# Altium footprint library CONN_HDR_MINI_ST.PcbLib: 116 footprints (part 5 of 10)
Each footprint in its own frame and in the unit in brackets; x right, y up, seen from the top. Pads: shape width x height; smd on the part's side, far side on the other; paste and mask are expansions set on the pad; w line width, h text height; cw(c..) or ccw(c..) is an arc to the next point about the centre after c.
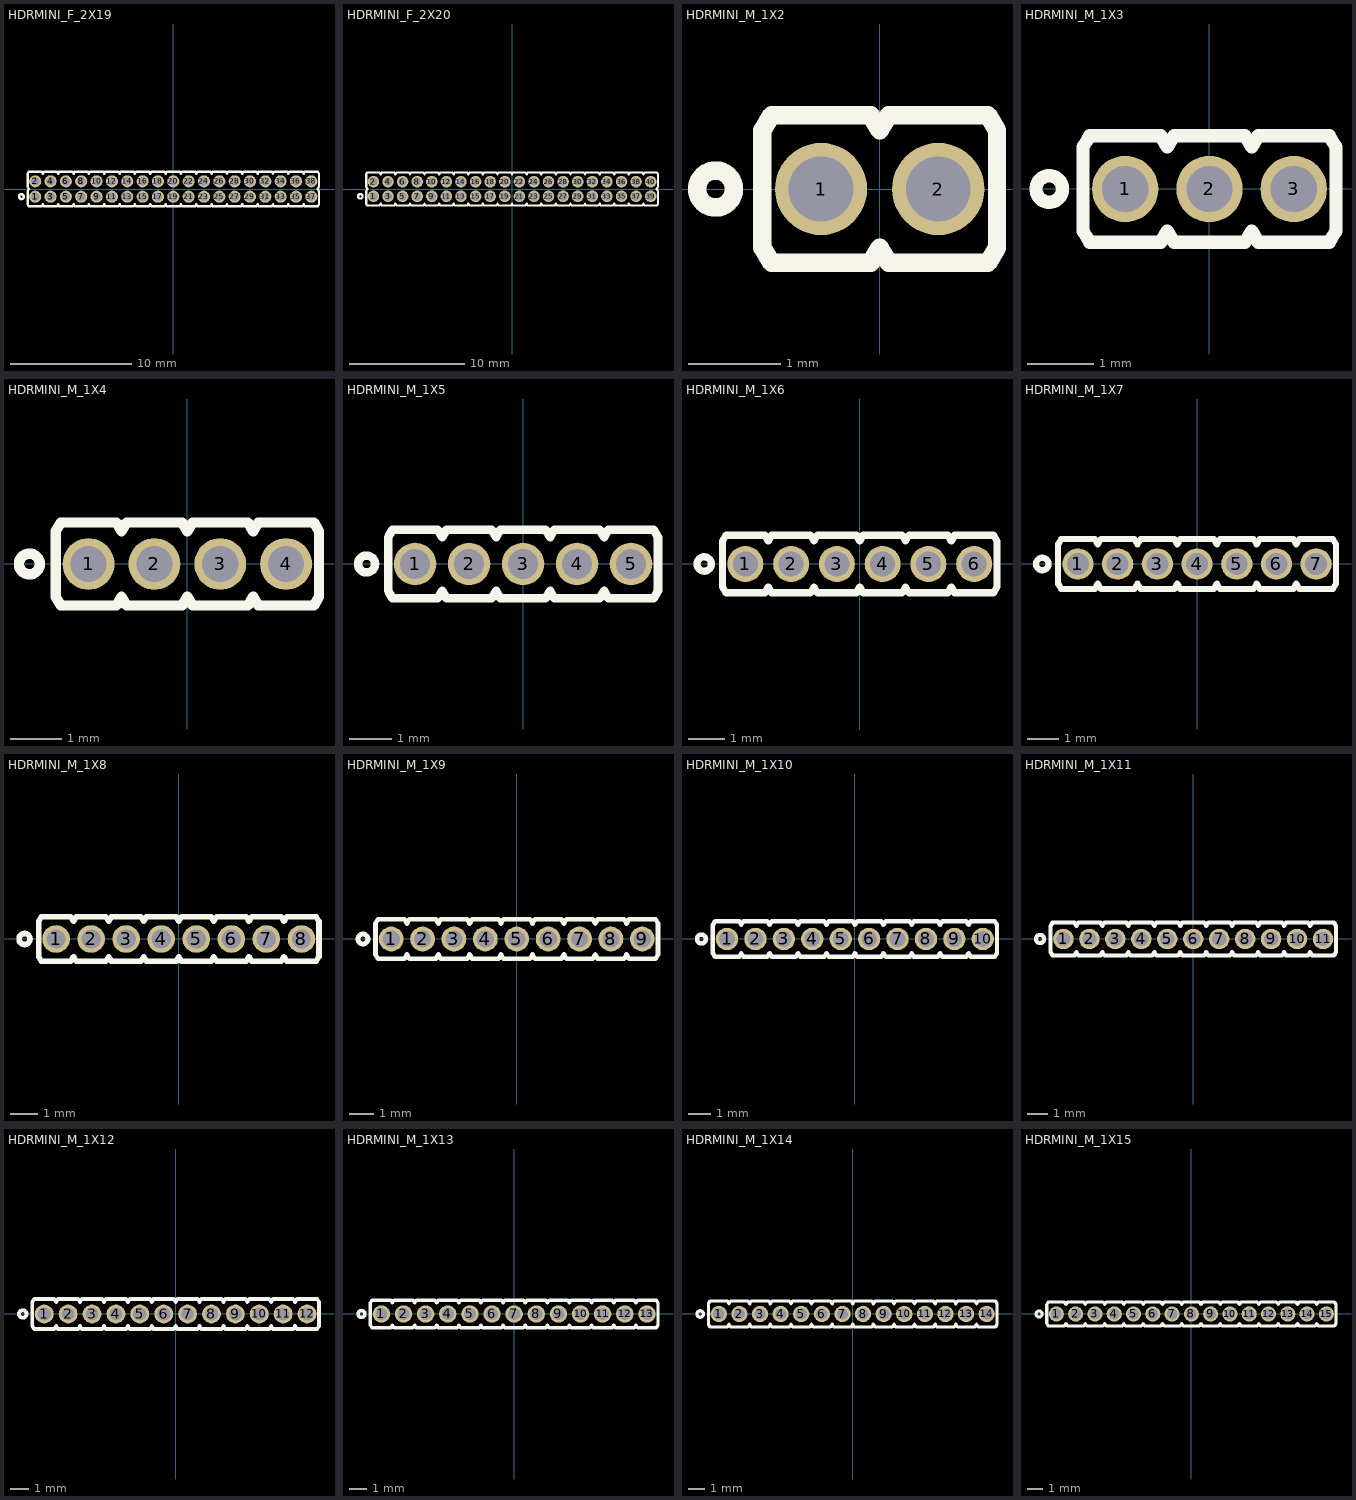
[diagram p4: the footprints below, top view; thin cyan lines are the x and y axes]

## HDRMINI_F_2X19 [mm] "mini header (50mil pitch)"
pads (38):
  round 1 hole 0.7 mask+0.05: 1(-11.43,-0.635) 2(-11.43,0.635) 3(-10.16,-0.635) 4(-10.16,0.635) 5(-8.89,-0.635) 6(-8.89,0.635) 7(-7.62,-0.635) 8(-7.62,0.635) 9(-6.35,-0.635) 10(-6.35,0.635) 11(-5.08,-0.635) 12(-5.08,0.635) 13(-3.81,-0.635) 14(-3.81,0.635) 15(-2.54,-0.635) 16(-2.54,0.635) 17(-1.27,-0.635) 18(-1.27,0.635) 19(0,-0.635) 20(0,0.635) 21(1.27,-0.635) 22(1.27,0.635) 23(2.54,-0.635) 24(2.54,0.635) 25(3.81,-0.635) 26(3.81,0.635) 27(5.08,-0.635) 28(5.08,0.635) 29(6.35,-0.635) 30(6.35,0.635) 31(7.62,-0.635) 32(7.62,0.635) 33(8.89,-0.635) 34(8.89,0.635) 35(10.16,-0.635) 36(10.16,0.635) 37(11.43,-0.635) 38(11.43,0.635)
Top Overlay:
  circle w0.2: c-12.573,-0.635 r0.2
  lines w0.2: -11.966,-0.035 -12.065,-0.2 -12.065,-1.27 -11.966,-1.435 -10.894,-1.435 -10.795,-1.27 -10.696,-1.435 -9.624,-1.435 -9.525,-1.27 -9.426,-1.435 -8.354,-1.435 -8.255,-1.27 -8.156,-1.435 -7.084,-1.435 -6.985,-1.27 -6.886,-1.435 -5.814,-1.435 -5.715,-1.27 -5.616,-1.435 -4.544,-1.435 -4.445,-1.27 -4.346,-1.435 -3.274,-1.435 -3.175,-1.27 -3.076,-1.435 -2.004,-1.435 -1.905,-1.27 -1.806,-1.435 -0.734,-1.435 -0.635,-1.27 -0.536,-1.435 0.536,-1.435 0.635,-1.27 0.734,-1.435 1.806,-1.435 1.905,-1.27 2.004,-1.435 3.076,-1.435 3.175,-1.27 3.274,-1.435 4.346,-1.435 4.445,-1.27 4.544,-1.435 5.616,-1.435 5.715,-1.27 5.814,-1.435 6.886,-1.435 6.985,-1.27 7.084,-1.435 8.156,-1.435 8.255,-1.27 8.354,-1.435 9.426,-1.435 9.525,-1.27 9.624,-1.435 10.696,-1.435 10.795,-1.27 10.894,-1.435 11.966,-1.435 12.065,-1.27 12.065,-0.2 11.966,-0.035 ; -11.966,0.035 -12.065,0.2 -12.065,1.27 -11.966,1.435 -10.894,1.435 -10.795,1.27 -10.696,1.435 -9.624,1.435 -9.525,1.27 -9.426,1.435 -8.354,1.435 -8.255,1.27 -8.156,1.435 -7.084,1.435 -6.985,1.27 -6.886,1.435 -5.814,1.435 -5.715,1.27 -5.616,1.435 -4.544,1.435 -4.445,1.27 -4.346,1.435 -3.274,1.435 -3.175,1.27 -3.076,1.435 -2.004,1.435 -1.905,1.27 -1.806,1.435 -0.734,1.435 -0.635,1.27 -0.536,1.435 0.536,1.435 0.635,1.27 0.734,1.435 1.806,1.435 1.905,1.27 2.004,1.435 3.076,1.435 3.175,1.27 3.274,1.435 4.346,1.435 4.445,1.27 4.544,1.435 5.616,1.435 5.715,1.27 5.814,1.435 6.886,1.435 6.985,1.27 7.084,1.435 8.156,1.435 8.255,1.27 8.354,1.435 9.426,1.435 9.525,1.27 9.624,1.435 10.696,1.435 10.795,1.27 10.894,1.435 11.966,1.435 12.065,1.27 12.065,0.2 11.966,0.035
3D body: height 7.3, standoff -2.5, extent -11.63,0.435 -11.23,0.835
3D body: height 2.8, standoff 0, extent -12.065,0 -10.795,1.27
3D body: height 7.3, standoff -2.5, extent -10.36,0.435 -9.96,0.835
3D body: height 2.8, standoff 0, extent -10.795,0 -9.525,1.27
3D body: height 7.3, standoff -2.5, extent -11.63,-0.835 -11.23,-0.435
3D body: height 2.8, standoff 0, extent -12.065,-1.27 -10.795,0
3D body: height 7.3, standoff -2.5, extent -10.36,-0.835 -9.96,-0.435
3D body: height 2.8, standoff 0, extent -10.795,-1.27 -9.525,0
3D body: height 7.3, standoff -2.5, extent -9.09,0.435 -8.69,0.835
3D body: height 2.8, standoff 0, extent -9.525,0 -8.255,1.27
3D body: height 7.3, standoff -2.5, extent -7.82,0.435 -7.42,0.835
3D body: height 2.8, standoff 0, extent -8.255,0 -6.985,1.27
3D body: height 7.3, standoff -2.5, extent -9.09,-0.835 -8.69,-0.435
3D body: height 2.8, standoff 0, extent -9.525,-1.27 -8.255,0
3D body: height 7.3, standoff -2.5, extent -7.82,-0.835 -7.42,-0.435
3D body: height 2.8, standoff 0, extent -8.255,-1.27 -6.985,0
3D body: height 7.3, standoff -2.5, extent -6.55,0.435 -6.15,0.835
3D body: height 2.8, standoff 0, extent -6.985,0 -5.715,1.27
3D body: height 7.3, standoff -2.5, extent -5.28,0.435 -4.88,0.835
3D body: height 2.8, standoff 0, extent -5.715,0 -4.445,1.27
3D body: height 7.3, standoff -2.5, extent -6.55,-0.835 -6.15,-0.435
3D body: height 2.8, standoff 0, extent -6.985,-1.27 -5.715,0
3D body: height 7.3, standoff -2.5, extent -5.28,-0.835 -4.88,-0.435
3D body: height 2.8, standoff 0, extent -5.715,-1.27 -4.445,0
3D body: height 7.3, standoff -2.5, extent -4.01,0.435 -3.61,0.835
3D body: height 2.8, standoff 0, extent -4.445,0 -3.175,1.27
3D body: height 7.3, standoff -2.5, extent -2.74,0.435 -2.34,0.835
3D body: height 2.8, standoff 0, extent -3.175,0 -1.905,1.27
3D body: height 7.3, standoff -2.5, extent -4.01,-0.835 -3.61,-0.435
3D body: height 2.8, standoff 0, extent -4.445,-1.27 -3.175,0
3D body: height 7.3, standoff -2.5, extent -2.74,-0.835 -2.34,-0.435
3D body: height 2.8, standoff 0, extent -3.175,-1.27 -1.905,0
3D body: height 7.3, standoff -2.5, extent -1.47,0.435 -1.07,0.835
3D body: height 2.8, standoff 0, extent -1.905,0 -0.635,1.27
3D body: height 7.3, standoff -2.5, extent -0.2,0.435 0.2,0.835
3D body: height 2.8, standoff 0, extent -0.635,0 0.635,1.27
3D body: height 7.3, standoff -2.5, extent -1.47,-0.835 -1.07,-0.435
3D body: height 2.8, standoff 0, extent -1.905,-1.27 -0.635,0
3D body: height 7.3, standoff -2.5, extent -0.2,-0.835 0.2,-0.435
3D body: height 2.8, standoff 0, extent -0.635,-1.27 0.635,0
3D body: height 7.3, standoff -2.5, extent 1.07,0.435 1.47,0.835
3D body: height 2.8, standoff 0, extent 0.635,0 1.905,1.27
3D body: height 7.3, standoff -2.5, extent 2.34,0.435 2.74,0.835
3D body: height 2.8, standoff 0, extent 1.905,0 3.175,1.27
3D body: height 7.3, standoff -2.5, extent 1.07,-0.835 1.47,-0.435
3D body: height 2.8, standoff 0, extent 0.635,-1.27 1.905,0
3D body: height 7.3, standoff -2.5, extent 2.34,-0.835 2.74,-0.435
3D body: height 2.8, standoff 0, extent 1.905,-1.27 3.175,0
3D body: height 7.3, standoff -2.5, extent 3.61,0.435 4.01,0.835
3D body: height 2.8, standoff 0, extent 3.175,0 4.445,1.27
3D body: height 7.3, standoff -2.5, extent 4.88,0.435 5.28,0.835
3D body: height 2.8, standoff 0, extent 4.445,0 5.715,1.27
3D body: height 7.3, standoff -2.5, extent 3.61,-0.835 4.01,-0.435
3D body: height 2.8, standoff 0, extent 3.175,-1.27 4.445,0
3D body: height 7.3, standoff -2.5, extent 4.88,-0.835 5.28,-0.435
3D body: height 2.8, standoff 0, extent 4.445,-1.27 5.715,0
3D body: height 7.3, standoff -2.5, extent 6.15,0.435 6.55,0.835
3D body: height 2.8, standoff 0, extent 5.715,0 6.985,1.27
3D body: height 7.3, standoff -2.5, extent 7.42,0.435 7.82,0.835
3D body: height 2.8, standoff 0, extent 6.985,0 8.255,1.27
3D body: height 7.3, standoff -2.5, extent 6.15,-0.835 6.55,-0.435
3D body: height 2.8, standoff 0, extent 5.715,-1.27 6.985,0
3D body: height 7.3, standoff -2.5, extent 7.42,-0.835 7.82,-0.435
3D body: height 2.8, standoff 0, extent 6.985,-1.27 8.255,0
3D body: height 7.3, standoff -2.5, extent 8.69,0.435 9.09,0.835
3D body: height 2.8, standoff 0, extent 8.255,0 9.525,1.27
3D body: height 7.3, standoff -2.5, extent 9.96,0.435 10.36,0.835
3D body: height 2.8, standoff 0, extent 9.525,0 10.795,1.27
3D body: height 7.3, standoff -2.5, extent 8.69,-0.835 9.09,-0.435
3D body: height 2.8, standoff 0, extent 8.255,-1.27 9.525,0
3D body: height 7.3, standoff -2.5, extent 9.96,-0.835 10.36,-0.435
3D body: height 2.8, standoff 0, extent 9.525,-1.27 10.795,0
3D body: height 7.3, standoff -2.5, extent 11.23,0.435 11.63,0.835
3D body: height 2.8, standoff 0, extent 10.795,0 12.065,1.27
3D body: height 7.3, standoff -2.5, extent 11.23,-0.835 11.63,-0.435
3D body: height 2.8, standoff 0, extent 10.795,-1.27 12.065,0

## HDRMINI_F_2X20 [mm] "mini header (50mil pitch)"
pads (40):
  round 1 hole 0.7 mask+0.05: 1(-12.065,-0.635) 2(-12.065,0.635) 3(-10.795,-0.635) 4(-10.795,0.635) 5(-9.525,-0.635) 6(-9.525,0.635) 7(-8.255,-0.635) 8(-8.255,0.635) 9(-6.985,-0.635) 10(-6.985,0.635) 11(-5.715,-0.635) 12(-5.715,0.635) 13(-4.445,-0.635) 14(-4.445,0.635) 15(-3.175,-0.635) 16(-3.175,0.635) 17(-1.905,-0.635) 18(-1.905,0.635) 19(-0.635,-0.635) 20(-0.635,0.635) 21(0.635,-0.635) 22(0.635,0.635) 23(1.905,-0.635) 24(1.905,0.635) 25(3.175,-0.635) 26(3.175,0.635) 27(4.445,-0.635) 28(4.445,0.635) 29(5.715,-0.635) 30(5.715,0.635) 31(6.985,-0.635) 32(6.985,0.635) 33(8.255,-0.635) 34(8.255,0.635) 35(9.525,-0.635) 36(9.525,0.635) 37(10.795,-0.635) 38(10.795,0.635) 39(12.065,-0.635) 40(12.065,0.635)
Top Overlay:
  circle w0.2: c-13.208,-0.635 r0.2
  lines w0.2: -12.601,-0.035 -12.7,-0.2 -12.7,-1.27 -12.601,-1.435 -11.529,-1.435 -11.43,-1.27 -11.331,-1.435 -10.259,-1.435 -10.16,-1.27 -10.061,-1.435 -8.989,-1.435 -8.89,-1.27 -8.791,-1.435 -7.719,-1.435 -7.62,-1.27 -7.521,-1.435 -6.449,-1.435 -6.35,-1.27 -6.251,-1.435 -5.179,-1.435 -5.08,-1.27 -4.981,-1.435 -3.909,-1.435 -3.81,-1.27 -3.711,-1.435 -2.639,-1.435 -2.54,-1.27 -2.441,-1.435 -1.369,-1.435 -1.27,-1.27 -1.171,-1.435 -0.099,-1.435 0,-1.27 0.099,-1.435 1.171,-1.435 1.27,-1.27 1.369,-1.435 2.441,-1.435 2.54,-1.27 2.639,-1.435 3.711,-1.435 3.81,-1.27 3.909,-1.435 4.981,-1.435 5.08,-1.27 5.179,-1.435 6.251,-1.435 6.35,-1.27 6.449,-1.435 7.521,-1.435 7.62,-1.27 7.719,-1.435 8.791,-1.435 8.89,-1.27 8.989,-1.435 10.061,-1.435 10.16,-1.27 10.259,-1.435 11.331,-1.435 11.43,-1.27 11.529,-1.435 12.601,-1.435 12.7,-1.27 12.7,-0.2 12.601,-0.035 ; -12.601,0.035 -12.7,0.2 -12.7,1.27 -12.601,1.435 -11.529,1.435 -11.43,1.27 -11.331,1.435 -10.259,1.435 -10.16,1.27 -10.061,1.435 -8.989,1.435 -8.89,1.27 -8.791,1.435 -7.719,1.435 -7.62,1.27 -7.521,1.435 -6.449,1.435 -6.35,1.27 -6.251,1.435 -5.179,1.435 -5.08,1.27 -4.981,1.435 -3.909,1.435 -3.81,1.27 -3.711,1.435 -2.639,1.435 -2.54,1.27 -2.441,1.435 -1.369,1.435 -1.27,1.27 -1.171,1.435 -0.099,1.435 0,1.27 0.099,1.435 1.171,1.435 1.27,1.27 1.369,1.435 2.441,1.435 2.54,1.27 2.639,1.435 3.711,1.435 3.81,1.27 3.909,1.435 4.981,1.435 5.08,1.27 5.179,1.435 6.251,1.435 6.35,1.27 6.449,1.435 7.521,1.435 7.62,1.27 7.719,1.435 8.791,1.435 8.89,1.27 8.989,1.435 10.061,1.435 10.16,1.27 10.259,1.435 11.331,1.435 11.43,1.27 11.529,1.435 12.601,1.435 12.7,1.27 12.7,0.2 12.601,0.035
3D body: height 2.8, standoff 0, extent 11.43,-1.27 12.7,0
3D body: height 7.3, standoff -2.5, extent 11.865,-0.835 12.265,-0.435
3D body: height 2.8, standoff 0, extent 10.16,-1.27 11.43,0
3D body: height 7.3, standoff -2.5, extent 10.595,-0.835 10.995,-0.435
3D body: height 2.8, standoff 0, extent 11.43,0 12.7,1.27
3D body: height 7.3, standoff -2.5, extent 11.865,0.435 12.265,0.835
3D body: height 2.8, standoff 0, extent 10.16,0 11.43,1.27
3D body: height 7.3, standoff -2.5, extent 10.595,0.435 10.995,0.835
3D body: height 2.8, standoff 0, extent 8.89,-1.27 10.16,0
3D body: height 7.3, standoff -2.5, extent 9.325,-0.835 9.725,-0.435
3D body: height 2.8, standoff 0, extent 7.62,-1.27 8.89,0
3D body: height 7.3, standoff -2.5, extent 8.055,-0.835 8.455,-0.435
3D body: height 2.8, standoff 0, extent 8.89,0 10.16,1.27
3D body: height 7.3, standoff -2.5, extent 9.325,0.435 9.725,0.835
3D body: height 2.8, standoff 0, extent 7.62,0 8.89,1.27
3D body: height 7.3, standoff -2.5, extent 8.055,0.435 8.455,0.835
3D body: height 2.8, standoff 0, extent 6.35,-1.27 7.62,0
3D body: height 7.3, standoff -2.5, extent 6.785,-0.835 7.185,-0.435
3D body: height 2.8, standoff 0, extent 5.08,-1.27 6.35,0
3D body: height 7.3, standoff -2.5, extent 5.515,-0.835 5.915,-0.435
3D body: height 2.8, standoff 0, extent 6.35,0 7.62,1.27
3D body: height 7.3, standoff -2.5, extent 6.785,0.435 7.185,0.835
3D body: height 2.8, standoff 0, extent 5.08,0 6.35,1.27
3D body: height 7.3, standoff -2.5, extent 5.515,0.435 5.915,0.835
3D body: height 2.8, standoff 0, extent 3.81,-1.27 5.08,0
3D body: height 7.3, standoff -2.5, extent 4.245,-0.835 4.645,-0.435
3D body: height 2.8, standoff 0, extent 2.54,-1.27 3.81,0
3D body: height 7.3, standoff -2.5, extent 2.975,-0.835 3.375,-0.435
3D body: height 2.8, standoff 0, extent 3.81,0 5.08,1.27
3D body: height 7.3, standoff -2.5, extent 4.245,0.435 4.645,0.835
3D body: height 2.8, standoff 0, extent 2.54,0 3.81,1.27
3D body: height 7.3, standoff -2.5, extent 2.975,0.435 3.375,0.835
3D body: height 2.8, standoff 0, extent 1.27,-1.27 2.54,0
3D body: height 7.3, standoff -2.5, extent 1.705,-0.835 2.105,-0.435
3D body: height 2.8, standoff 0, extent 0,-1.27 1.27,0
3D body: height 7.3, standoff -2.5, extent 0.435,-0.835 0.835,-0.435
3D body: height 2.8, standoff 0, extent 1.27,0 2.54,1.27
3D body: height 7.3, standoff -2.5, extent 1.705,0.435 2.105,0.835
3D body: height 2.8, standoff 0, extent 0,0 1.27,1.27
3D body: height 7.3, standoff -2.5, extent 0.435,0.435 0.835,0.835
3D body: height 2.8, standoff 0, extent -1.27,-1.27 0,0
3D body: height 7.3, standoff -2.5, extent -0.835,-0.835 -0.435,-0.435
3D body: height 2.8, standoff 0, extent -2.54,-1.27 -1.27,0
3D body: height 7.3, standoff -2.5, extent -2.105,-0.835 -1.705,-0.435
3D body: height 2.8, standoff 0, extent -1.27,0 0,1.27
3D body: height 7.3, standoff -2.5, extent -0.835,0.435 -0.435,0.835
3D body: height 2.8, standoff 0, extent -2.54,0 -1.27,1.27
3D body: height 7.3, standoff -2.5, extent -2.105,0.435 -1.705,0.835
3D body: height 2.8, standoff 0, extent -3.81,-1.27 -2.54,0
3D body: height 7.3, standoff -2.5, extent -3.375,-0.835 -2.975,-0.435
3D body: height 2.8, standoff 0, extent -5.08,-1.27 -3.81,0
3D body: height 7.3, standoff -2.5, extent -4.645,-0.835 -4.245,-0.435
3D body: height 2.8, standoff 0, extent -3.81,0 -2.54,1.27
3D body: height 7.3, standoff -2.5, extent -3.375,0.435 -2.975,0.835
3D body: height 2.8, standoff 0, extent -5.08,0 -3.81,1.27
3D body: height 7.3, standoff -2.5, extent -4.645,0.435 -4.245,0.835
3D body: height 2.8, standoff 0, extent -6.35,-1.27 -5.08,0
3D body: height 7.3, standoff -2.5, extent -5.915,-0.835 -5.515,-0.435
3D body: height 2.8, standoff 0, extent -7.62,-1.27 -6.35,0
3D body: height 7.3, standoff -2.5, extent -7.185,-0.835 -6.785,-0.435
3D body: height 2.8, standoff 0, extent -6.35,0 -5.08,1.27
3D body: height 7.3, standoff -2.5, extent -5.915,0.435 -5.515,0.835
3D body: height 2.8, standoff 0, extent -7.62,0 -6.35,1.27
3D body: height 7.3, standoff -2.5, extent -7.185,0.435 -6.785,0.835
3D body: height 2.8, standoff 0, extent -8.89,-1.27 -7.62,0
3D body: height 7.3, standoff -2.5, extent -8.455,-0.835 -8.055,-0.435
3D body: height 2.8, standoff 0, extent -10.16,-1.27 -8.89,0
3D body: height 7.3, standoff -2.5, extent -9.725,-0.835 -9.325,-0.435
3D body: height 2.8, standoff 0, extent -8.89,0 -7.62,1.27
3D body: height 7.3, standoff -2.5, extent -8.455,0.435 -8.055,0.835
3D body: height 2.8, standoff 0, extent -10.16,0 -8.89,1.27
3D body: height 7.3, standoff -2.5, extent -9.725,0.435 -9.325,0.835
3D body: height 2.8, standoff 0, extent -11.43,-1.27 -10.16,0
3D body: height 7.3, standoff -2.5, extent -10.995,-0.835 -10.595,-0.435
3D body: height 2.8, standoff 0, extent -12.7,-1.27 -11.43,0
3D body: height 7.3, standoff -2.5, extent -12.265,-0.835 -11.865,-0.435
3D body: height 2.8, standoff 0, extent -11.43,0 -10.16,1.27
3D body: height 7.3, standoff -2.5, extent -10.995,0.435 -10.595,0.835
3D body: height 2.8, standoff 0, extent -12.7,0 -11.43,1.27
3D body: height 7.3, standoff -2.5, extent -12.265,0.435 -11.865,0.835

## HDRMINI_M_1X2 [mm] "mini header (50mil pitch)"
pads (2):
  round 1 / inner round 1 / far side oval 1x1.4 hole 0.7 mask+0.05: 1(-0.635,0) 2(0.635,0)
Top Overlay:
  circle w0.2: c-1.778,0 r0.2
  lines w0.2: -1.27,-0.635 -1.171,-0.8 -0.099,-0.8 0,-0.635 0.099,-0.8 1.171,-0.8 1.27,-0.635 1.27,0.635 1.171,0.8 0.099,0.8 0,0.635 -0.099,0.8 -1.171,0.8 -1.27,0.635 -1.27,-0.635
3D body: height 7.3, standoff -2.5, extent -0.835,-0.2 -0.435,0.2
3D body: height 2.8, standoff 0, extent -1.27,-0.635 0,0.635
3D body: height 2.8, standoff 0, extent 0,-0.635 1.27,0.635
3D body: height 7.3, standoff -2.5, extent 0.435,-0.2 0.835,0.2

## HDRMINI_M_1X3 [mm] "mini header (50mil pitch)"
pads (3):
  round 1 / inner round 1 / far side oval 1x1.4 hole 0.7 mask+0.05: 1(-1.27,0) 2(0,0) 3(1.27,0)
Top Overlay:
  circle w0.2: c-2.413,0 r0.2
  lines w0.2: -1.905,-0.635 -1.806,-0.8 -0.734,-0.8 -0.635,-0.635 -0.536,-0.8 0.536,-0.8 0.635,-0.635 0.734,-0.8 1.806,-0.8 1.905,-0.635 1.905,0.635 1.806,0.8 0.734,0.8 0.635,0.635 0.536,0.8 -0.536,0.8 -0.635,0.635 -0.734,0.8 -1.806,0.8 -1.905,0.635 -1.905,-0.635
3D body: height 7.3, standoff -2.5, extent 1.07,-0.2 1.47,0.2
3D body: height 2.8, standoff 0, extent 0.635,-0.635 1.905,0.635
3D body: height 7.3, standoff -2.5, extent -0.2,-0.2 0.2,0.2
3D body: height 2.8, standoff 0, extent -0.635,-0.635 0.635,0.635
3D body: height 7.3, standoff -2.5, extent -1.47,-0.2 -1.07,0.2
3D body: height 2.8, standoff 0, extent -1.905,-0.635 -0.635,0.635

## HDRMINI_M_1X4 [mm] "mini header (50mil pitch)"
pads (4):
  round 1 / inner round 1 / far side oval 1x1.4 hole 0.7 mask+0.05: 1(-1.905,0) 2(-0.635,0) 3(0.635,0) 4(1.905,0)
Top Overlay:
  circle w0.2: c-3.048,0 r0.2
  lines w0.2: -2.54,-0.635 -2.441,-0.8 -1.369,-0.8 -1.27,-0.635 -1.171,-0.8 -0.099,-0.8 0,-0.635 0.099,-0.8 1.171,-0.8 1.27,-0.635 1.369,-0.8 2.441,-0.8 2.54,-0.635 2.54,0.635 2.441,0.8 1.369,0.8 1.27,0.635 1.171,0.8 0.099,0.8 0,0.635 -0.099,0.8 -1.171,0.8 -1.27,0.635 -1.369,0.8 -2.441,0.8 -2.54,0.635 -2.54,-0.635
3D body: height 7.3, standoff -2.5, extent -0.835,-0.2 -0.435,0.2
3D body: height 2.8, standoff 0, extent -1.27,-0.635 0,0.635
3D body: height 7.3, standoff -2.5, extent 0.435,-0.2 0.835,0.2
3D body: height 2.8, standoff 0, extent 0,-0.635 1.27,0.635
3D body: height 7.3, standoff -2.5, extent 1.705,-0.2 2.105,0.2
3D body: height 2.8, standoff 0, extent 1.27,-0.635 2.54,0.635
3D body: height 7.3, standoff -2.5, extent -2.105,-0.2 -1.705,0.2
3D body: height 2.8, standoff 0, extent -2.54,-0.635 -1.27,0.635

## HDRMINI_M_1X5 [mm] "mini header (50mil pitch)"
pads (5):
  round 1 / inner round 1 / far side oval 1x1.4 hole 0.7 mask+0.05: 1(-2.54,0) 2(-1.27,0) 3(0,0) 4(1.27,0) 5(2.54,0)
Top Overlay:
  circle w0.2: c-3.683,0 r0.2
  lines w0.2: -3.175,-0.635 -3.076,-0.8 -2.004,-0.8 -1.905,-0.635 -1.806,-0.8 -0.734,-0.8 -0.635,-0.635 -0.536,-0.8 0.536,-0.8 0.635,-0.635 0.734,-0.8 1.806,-0.8 1.905,-0.635 2.004,-0.8 3.076,-0.8 3.175,-0.635 3.175,0.635 3.076,0.8 2.004,0.8 1.905,0.635 1.806,0.8 0.734,0.8 0.635,0.635 0.536,0.8 -0.536,0.8 -0.635,0.635 -0.734,0.8 -1.806,0.8 -1.905,0.635 -2.004,0.8 -3.076,0.8 -3.175,0.635 -3.175,-0.635
3D body: height 7.3, standoff -2.5, extent -1.47,-0.2 -1.07,0.2
3D body: height 2.8, standoff 0, extent -1.905,-0.635 -0.635,0.635
3D body: height 7.3, standoff -2.5, extent -0.2,-0.2 0.2,0.2
3D body: height 2.8, standoff 0, extent -0.635,-0.635 0.635,0.635
3D body: height 7.3, standoff -2.5, extent 1.07,-0.2 1.47,0.2
3D body: height 2.8, standoff 0, extent 0.635,-0.635 1.905,0.635
3D body: height 7.3, standoff -2.5, extent 2.34,-0.2 2.74,0.2
3D body: height 2.8, standoff 0, extent 1.905,-0.635 3.175,0.635
3D body: height 7.3, standoff -2.5, extent -2.74,-0.2 -2.34,0.2
3D body: height 2.8, standoff 0, extent -3.175,-0.635 -1.905,0.635

## HDRMINI_M_1X6 [mm] "mini header (50mil pitch)"
pads (6):
  round 1 / inner round 1 / far side oval 1x1.4 hole 0.7 mask+0.05: 1(-3.175,0) 2(-1.905,0) 3(-0.635,0) 4(0.635,0) 5(1.905,0) 6(3.175,0)
Top Overlay:
  circle w0.2: c-4.318,0 r0.2
  lines w0.2: -3.81,-0.635 -3.711,-0.8 -2.639,-0.8 -2.54,-0.635 -2.441,-0.8 -1.369,-0.8 -1.27,-0.635 -1.171,-0.8 -0.099,-0.8 0,-0.635 0.099,-0.8 1.171,-0.8 1.27,-0.635 1.369,-0.8 2.441,-0.8 2.54,-0.635 2.639,-0.8 3.711,-0.8 3.81,-0.635 3.81,0.635 3.711,0.8 2.639,0.8 2.54,0.635 2.441,0.8 1.369,0.8 1.27,0.635 1.171,0.8 0.099,0.8 0,0.635 -0.099,0.8 -1.171,0.8 -1.27,0.635 -1.369,0.8 -2.441,0.8 -2.54,0.635 -2.639,0.8 -3.711,0.8 -3.81,0.635 -3.81,-0.635
3D body: height 2.8, standoff 0, extent -2.54,-0.635 -1.27,0.635
3D body: height 7.3, standoff -2.5, extent -2.105,-0.2 -1.705,0.2
3D body: height 2.8, standoff 0, extent -1.27,-0.635 0,0.635
3D body: height 7.3, standoff -2.5, extent -0.835,-0.2 -0.435,0.2
3D body: height 2.8, standoff 0, extent 0,-0.635 1.27,0.635
3D body: height 7.3, standoff -2.5, extent 0.435,-0.2 0.835,0.2
3D body: height 2.8, standoff 0, extent 1.27,-0.635 2.54,0.635
3D body: height 7.3, standoff -2.5, extent 1.705,-0.2 2.105,0.2
3D body: height 2.8, standoff 0, extent 2.54,-0.635 3.81,0.635
3D body: height 7.3, standoff -2.5, extent 2.975,-0.2 3.375,0.2
3D body: height 7.3, standoff -2.5, extent -3.375,-0.2 -2.975,0.2
3D body: height 2.8, standoff 0, extent -3.81,-0.635 -2.54,0.635

## HDRMINI_M_1X7 [mm] "mini header (50mil pitch)"
pads (7):
  round 1 / inner round 1 / far side oval 1x1.4 hole 0.7 mask+0.05: 1(-3.81,0) 2(-2.54,0) 3(-1.27,0) 4(0,0) 5(1.27,0) 6(2.54,0) 7(3.81,0)
Top Overlay:
  circle w0.2: c-4.953,0 r0.2
  lines w0.2: -4.445,-0.635 -4.346,-0.8 -3.274,-0.8 -3.175,-0.635 -3.076,-0.8 -2.004,-0.8 -1.905,-0.635 -1.806,-0.8 -0.734,-0.8 -0.635,-0.635 -0.536,-0.8 0.536,-0.8 0.635,-0.635 0.734,-0.8 1.806,-0.8 1.905,-0.635 2.004,-0.8 3.076,-0.8 3.175,-0.635 3.274,-0.8 4.346,-0.8 4.445,-0.635 4.445,0.635 4.346,0.8 3.274,0.8 3.175,0.635 3.076,0.8 2.004,0.8 1.905,0.635 1.806,0.8 0.734,0.8 0.635,0.635 0.536,0.8 -0.536,0.8 -0.635,0.635 -0.734,0.8 -1.806,0.8 -1.905,0.635 -2.004,0.8 -3.076,0.8 -3.175,0.635 -3.274,0.8 -4.346,0.8 -4.445,0.635 -4.445,-0.635
3D body: height 2.8, standoff 0, extent -3.175,-0.635 -1.905,0.635
3D body: height 7.3, standoff -2.5, extent -2.74,-0.2 -2.34,0.2
3D body: height 2.8, standoff 0, extent -1.905,-0.635 -0.635,0.635
3D body: height 7.3, standoff -2.5, extent -1.47,-0.2 -1.07,0.2
3D body: height 2.8, standoff 0, extent -0.635,-0.635 0.635,0.635
3D body: height 7.3, standoff -2.5, extent -0.2,-0.2 0.2,0.2
3D body: height 2.8, standoff 0, extent 0.635,-0.635 1.905,0.635
3D body: height 7.3, standoff -2.5, extent 1.07,-0.2 1.47,0.2
3D body: height 2.8, standoff 0, extent 1.905,-0.635 3.175,0.635
3D body: height 7.3, standoff -2.5, extent 2.34,-0.2 2.74,0.2
3D body: height 7.3, standoff -2.5, extent 3.61,-0.2 4.01,0.2
3D body: height 2.8, standoff 0, extent 3.175,-0.635 4.445,0.635
3D body: height 7.3, standoff -2.5, extent -4.01,-0.2 -3.61,0.2
3D body: height 2.8, standoff 0, extent -4.445,-0.635 -3.175,0.635

## HDRMINI_M_1X8 [mm] "mini header (50mil pitch)"
pads (8):
  round 1 / inner round 1 / far side oval 1x1.4 hole 0.7 mask+0.05: 1(-4.445,0) 2(-3.175,0) 3(-1.905,0) 4(-0.635,0) 5(0.635,0) 6(1.905,0) 7(3.175,0) 8(4.445,0)
Top Overlay:
  circle w0.2: c-5.588,0 r0.2
  lines w0.2: -5.08,-0.635 -5.08,0.635 -4.981,0.8 -3.909,0.8 -3.81,0.635 -3.711,0.8 -2.639,0.8 -2.54,0.635 -2.441,0.8 -1.369,0.8 -1.27,0.635 -1.171,0.8 -0.099,0.8 0,0.635 0.099,0.8 1.171,0.8 1.27,0.635 1.369,0.8 2.441,0.8 2.54,0.635 2.639,0.8 3.711,0.8 3.81,0.635 3.909,0.8 4.981,0.8 5.08,0.635 5.08,-0.635 4.981,-0.8 3.909,-0.8 3.81,-0.635 3.711,-0.8 2.639,-0.8 2.54,-0.635 2.441,-0.8 1.369,-0.8 1.27,-0.635 1.171,-0.8 0.099,-0.8 0,-0.635 -0.099,-0.8 -1.171,-0.8 -1.27,-0.635 -1.369,-0.8 -2.441,-0.8 -2.54,-0.635 -2.639,-0.8 -3.711,-0.8 -3.81,-0.635 -3.909,-0.8 -4.981,-0.8 -5.08,-0.635
3D body: height 2.8, standoff 0, extent -5.08,-0.635 -3.81,0.635
3D body: height 7.3, standoff -2.5, extent -4.645,-0.2 -4.245,0.2
3D body: height 2.8, standoff 0, extent 3.81,-0.635 5.08,0.635
3D body: height 7.3, standoff -2.5, extent 4.245,-0.2 4.645,0.2
3D body: height 2.8, standoff 0, extent 2.54,-0.635 3.81,0.635
3D body: height 7.3, standoff -2.5, extent 2.975,-0.2 3.375,0.2
3D body: height 7.3, standoff -2.5, extent 1.705,-0.2 2.105,0.2
3D body: height 2.8, standoff 0, extent 1.27,-0.635 2.54,0.635
3D body: height 7.3, standoff -2.5, extent 0.435,-0.2 0.835,0.2
3D body: height 2.8, standoff 0, extent 0,-0.635 1.27,0.635
3D body: height 7.3, standoff -2.5, extent -0.835,-0.2 -0.435,0.2
3D body: height 2.8, standoff 0, extent -1.27,-0.635 0,0.635
3D body: height 7.3, standoff -2.5, extent -2.105,-0.2 -1.705,0.2
3D body: height 2.8, standoff 0, extent -2.54,-0.635 -1.27,0.635
3D body: height 7.3, standoff -2.5, extent -3.375,-0.2 -2.975,0.2
3D body: height 2.8, standoff 0, extent -3.81,-0.635 -2.54,0.635

## HDRMINI_M_1X9 [mm] "mini header (50mil pitch)"
pads (9):
  round 1 / inner round 1 / far side oval 1x1.4 hole 0.7 mask+0.05: 1(-5.08,0) 2(-3.81,0) 3(-2.54,0) 4(-1.27,0) 5(0,0) 6(1.27,0) 7(2.54,0) 8(3.81,0) 9(5.08,0)
Top Overlay:
  circle w0.2: c-6.223,0 r0.2
  lines w0.2: -5.715,-0.635 -5.616,-0.8 -4.544,-0.8 -4.445,-0.635 -4.346,-0.8 -3.274,-0.8 -3.175,-0.635 -3.076,-0.8 -2.004,-0.8 -1.905,-0.635 -1.806,-0.8 -0.734,-0.8 -0.635,-0.635 -0.536,-0.8 0.536,-0.8 0.635,-0.635 0.734,-0.8 1.806,-0.8 1.905,-0.635 2.004,-0.8 3.076,-0.8 3.175,-0.635 3.274,-0.8 4.346,-0.8 4.445,-0.635 4.544,-0.8 5.616,-0.8 5.715,-0.635 5.715,0.635 5.616,0.8 4.544,0.8 4.445,0.635 4.346,0.8 3.274,0.8 3.175,0.635 3.076,0.8 2.004,0.8 1.905,0.635 1.806,0.8 0.734,0.8 0.635,0.635 0.536,0.8 -0.536,0.8 -0.635,0.635 -0.734,0.8 -1.806,0.8 -1.905,0.635 -2.004,0.8 -3.076,0.8 -3.175,0.635 -3.274,0.8 -4.346,0.8 -4.445,0.635 -4.544,0.8 -5.616,0.8 -5.715,0.635 -5.715,-0.635
3D body: height 7.3, standoff -2.5, extent -5.28,-0.2 -4.88,0.2
3D body: height 2.8, standoff 0, extent -5.715,-0.635 -4.445,0.635
3D body: height 7.3, standoff -2.5, extent -4.01,-0.2 -3.61,0.2
3D body: height 2.8, standoff 0, extent -4.445,-0.635 -3.175,0.635
3D body: height 7.3, standoff -2.5, extent -2.74,-0.2 -2.34,0.2
3D body: height 2.8, standoff 0, extent -3.175,-0.635 -1.905,0.635
3D body: height 7.3, standoff -2.5, extent -1.47,-0.2 -1.07,0.2
3D body: height 2.8, standoff 0, extent -1.905,-0.635 -0.635,0.635
3D body: height 7.3, standoff -2.5, extent -0.2,-0.2 0.2,0.2
3D body: height 2.8, standoff 0, extent -0.635,-0.635 0.635,0.635
3D body: height 7.3, standoff -2.5, extent 1.07,-0.2 1.47,0.2
3D body: height 2.8, standoff 0, extent 0.635,-0.635 1.905,0.635
3D body: height 7.3, standoff -2.5, extent 2.34,-0.2 2.74,0.2
3D body: height 2.8, standoff 0, extent 1.905,-0.635 3.175,0.635
3D body: height 7.3, standoff -2.5, extent 3.61,-0.2 4.01,0.2
3D body: height 2.8, standoff 0, extent 3.175,-0.635 4.445,0.635
3D body: height 7.3, standoff -2.5, extent 4.88,-0.2 5.28,0.2
3D body: height 2.8, standoff 0, extent 4.445,-0.635 5.715,0.635

## HDRMINI_M_1X10 [mm] "mini header (50mil pitch)"
pads (10):
  round 1 / inner round 1 / far side oval 1x1.4 hole 0.7 mask+0.05: 1(-5.715,0) 2(-4.445,0) 3(-3.175,0) 4(-1.905,0) 5(-0.635,0) 6(0.635,0) 7(1.905,0) 8(3.175,0) 9(4.445,0) 10(5.715,0)
Top Overlay:
  circle w0.2: c-6.858,0 r0.2
  lines w0.2: -6.35,-0.635 -6.251,-0.8 -5.179,-0.8 -5.08,-0.635 -4.981,-0.8 -3.909,-0.8 -3.81,-0.635 -3.711,-0.8 -2.639,-0.8 -2.54,-0.635 -2.441,-0.8 -1.369,-0.8 -1.27,-0.635 -1.171,-0.8 -0.099,-0.8 0,-0.635 0.099,-0.8 1.171,-0.8 1.27,-0.635 1.369,-0.8 2.441,-0.8 2.54,-0.635 2.639,-0.8 3.711,-0.8 3.81,-0.635 3.909,-0.8 4.981,-0.8 5.08,-0.635 5.179,-0.8 6.251,-0.8 6.35,-0.635 6.35,0.635 6.251,0.8 5.179,0.8 5.08,0.635 4.981,0.8 3.909,0.8 3.81,0.635 3.711,0.8 2.639,0.8 2.54,0.635 2.441,0.8 1.369,0.8 1.27,0.635 1.171,0.8 0.099,0.8 0,0.635 -0.099,0.8 -1.171,0.8 -1.27,0.635 -1.369,0.8 -2.441,0.8 -2.54,0.635 -2.639,0.8 -3.711,0.8 -3.81,0.635 -3.909,0.8 -4.981,0.8 -5.08,0.635 -5.179,0.8 -6.251,0.8 -6.35,0.635 -6.35,-0.635
3D body: height 7.3, standoff -2.5, extent 5.515,-0.2 5.915,0.2
3D body: height 2.8, standoff 0, extent 5.08,-0.635 6.35,0.635
3D body: height 7.3, standoff -2.5, extent -5.915,-0.2 -5.515,0.2
3D body: height 2.8, standoff 0, extent -6.35,-0.635 -5.08,0.635
3D body: height 7.3, standoff -2.5, extent -4.645,-0.2 -4.245,0.2
3D body: height 2.8, standoff 0, extent -5.08,-0.635 -3.81,0.635
3D body: height 7.3, standoff -2.5, extent -3.375,-0.2 -2.975,0.2
3D body: height 2.8, standoff 0, extent -3.81,-0.635 -2.54,0.635
3D body: height 7.3, standoff -2.5, extent -2.105,-0.2 -1.705,0.2
3D body: height 2.8, standoff 0, extent -2.54,-0.635 -1.27,0.635
3D body: height 7.3, standoff -2.5, extent -0.835,-0.2 -0.435,0.2
3D body: height 2.8, standoff 0, extent -1.27,-0.635 0,0.635
3D body: height 7.3, standoff -2.5, extent 0.435,-0.2 0.835,0.2
3D body: height 2.8, standoff 0, extent 0,-0.635 1.27,0.635
3D body: height 7.3, standoff -2.5, extent 1.705,-0.2 2.105,0.2
3D body: height 2.8, standoff 0, extent 1.27,-0.635 2.54,0.635
3D body: height 7.3, standoff -2.5, extent 2.975,-0.2 3.375,0.2
3D body: height 2.8, standoff 0, extent 2.54,-0.635 3.81,0.635
3D body: height 7.3, standoff -2.5, extent 4.245,-0.2 4.645,0.2
3D body: height 2.8, standoff 0, extent 3.81,-0.635 5.08,0.635

## HDRMINI_M_1X11 [mm] "mini header (50mil pitch)"
pads (11):
  round 1 / inner round 1 / far side oval 1x1.4 hole 0.7 mask+0.05: 1(-6.35,0) 2(-5.08,0) 3(-3.81,0) 4(-2.54,0) 5(-1.27,0) 6(0,0) 7(1.27,0) 8(2.54,0) 9(3.81,0) 10(5.08,0) 11(6.35,0)
Top Overlay:
  circle w0.2: c-7.493,0 r0.2
  lines w0.2: -6.985,-0.635 -6.886,-0.8 -5.814,-0.8 -5.715,-0.635 -5.616,-0.8 -4.544,-0.8 -4.445,-0.635 -4.346,-0.8 -3.274,-0.8 -3.175,-0.635 -3.076,-0.8 -2.004,-0.8 -1.905,-0.635 -1.806,-0.8 -0.734,-0.8 -0.635,-0.635 -0.536,-0.8 0.536,-0.8 0.635,-0.635 0.734,-0.8 1.806,-0.8 1.905,-0.635 2.004,-0.8 3.076,-0.8 3.175,-0.635 3.274,-0.8 4.346,-0.8 4.445,-0.635 4.544,-0.8 5.616,-0.8 5.715,-0.635 5.814,-0.8 6.886,-0.8 6.985,-0.635 6.985,0.635 6.886,0.8 5.814,0.8 5.715,0.635 5.616,0.8 4.544,0.8 4.445,0.635 4.346,0.8 3.274,0.8 3.175,0.635 3.076,0.8 2.004,0.8 1.905,0.635 1.806,0.8 0.734,0.8 0.635,0.635 0.536,0.8 -0.536,0.8 -0.635,0.635 -0.734,0.8 -1.806,0.8 -1.905,0.635 -2.004,0.8 -3.076,0.8 -3.175,0.635 -3.274,0.8 -4.346,0.8 -4.445,0.635 -4.544,0.8 -5.616,0.8 -5.715,0.635 -5.814,0.8 -6.886,0.8 -6.985,0.635 -6.985,-0.635
3D body: height 2.8, standoff 0, extent 3.175,-0.635 4.445,0.635
3D body: height 7.3, standoff -2.5, extent 3.61,-0.2 4.01,0.2
3D body: height 2.8, standoff 0, extent 1.905,-0.635 3.175,0.635
3D body: height 7.3, standoff -2.5, extent 2.34,-0.2 2.74,0.2
3D body: height 2.8, standoff 0, extent 0.635,-0.635 1.905,0.635
3D body: height 7.3, standoff -2.5, extent 1.07,-0.2 1.47,0.2
3D body: height 2.8, standoff 0, extent -0.635,-0.635 0.635,0.635
3D body: height 7.3, standoff -2.5, extent -0.2,-0.2 0.2,0.2
3D body: height 2.8, standoff 0, extent -1.905,-0.635 -0.635,0.635
3D body: height 7.3, standoff -2.5, extent -1.47,-0.2 -1.07,0.2
3D body: height 2.8, standoff 0, extent -3.175,-0.635 -1.905,0.635
3D body: height 7.3, standoff -2.5, extent -2.74,-0.2 -2.34,0.2
3D body: height 2.8, standoff 0, extent -4.445,-0.635 -3.175,0.635
3D body: height 7.3, standoff -2.5, extent -4.01,-0.2 -3.61,0.2
3D body: height 2.8, standoff 0, extent -5.715,-0.635 -4.445,0.635
3D body: height 7.3, standoff -2.5, extent -5.28,-0.2 -4.88,0.2
3D body: height 2.8, standoff 0, extent -6.985,-0.635 -5.715,0.635
3D body: height 7.3, standoff -2.5, extent -6.55,-0.2 -6.15,0.2
3D body: height 2.8, standoff 0, extent 4.445,-0.635 5.715,0.635
3D body: height 7.3, standoff -2.5, extent 4.88,-0.2 5.28,0.2
3D body: height 2.8, standoff 0, extent 5.715,-0.635 6.985,0.635
3D body: height 7.3, standoff -2.5, extent 6.15,-0.2 6.55,0.2

## HDRMINI_M_1X12 [mm] "mini header (50mil pitch)"
pads (12):
  round 1 / inner round 1 / far side oval 1x1.4 hole 0.7 mask+0.05: 1(-6.985,0) 2(-5.715,0) 3(-4.445,0) 4(-3.175,0) 5(-1.905,0) 6(-0.635,0) 7(0.635,0) 8(1.905,0) 9(3.175,0) 10(4.445,0) 11(5.715,0) 12(6.985,0)
Top Overlay:
  circle w0.2: c-8.128,0 r0.2
  lines w0.2: -7.62,-0.635 -7.62,0.635 -7.521,0.8 -6.449,0.8 -6.35,0.635 -6.251,0.8 -5.179,0.8 -5.08,0.635 -4.981,0.8 -3.909,0.8 -3.81,0.635 -3.711,0.8 -2.639,0.8 -2.54,0.635 -2.441,0.8 -1.369,0.8 -1.27,0.635 -1.171,0.8 -0.099,0.8 0,0.635 0.099,0.8 1.171,0.8 1.27,0.635 1.369,0.8 2.441,0.8 2.54,0.635 2.639,0.8 3.711,0.8 3.81,0.635 3.909,0.8 4.981,0.8 5.08,0.635 5.179,0.8 6.251,0.8 6.35,0.635 6.45,0.8 7.522,0.8 7.621,0.635 7.621,-0.635 7.522,-0.8 6.45,-0.8 6.351,-0.635 6.251,-0.8 5.179,-0.8 5.08,-0.635 4.981,-0.8 3.909,-0.8 3.81,-0.635 3.711,-0.8 2.639,-0.8 2.54,-0.635 2.441,-0.8 1.369,-0.8 1.27,-0.635 1.171,-0.8 0.099,-0.8 0,-0.635 -0.099,-0.8 -1.171,-0.8 -1.27,-0.635 -1.369,-0.8 -2.441,-0.8 -2.54,-0.635 -2.639,-0.8 -3.711,-0.8 -3.81,-0.635 -3.909,-0.8 -4.981,-0.8 -5.08,-0.635 -5.179,-0.8 -6.251,-0.8 -6.35,-0.635 -6.449,-0.8 -7.521,-0.8 -7.62,-0.635
3D body: height 2.8, standoff 0, extent 2.54,-0.635 3.81,0.635
3D body: height 7.3, standoff -2.5, extent 2.975,-0.2 3.375,0.2
3D body: height 2.8, standoff 0, extent 1.27,-0.635 2.54,0.635
3D body: height 7.3, standoff -2.5, extent 1.705,-0.2 2.105,0.2
3D body: height 2.8, standoff 0, extent 0,-0.635 1.27,0.635
3D body: height 7.3, standoff -2.5, extent 0.435,-0.2 0.835,0.2
3D body: height 2.8, standoff 0, extent -1.27,-0.635 0,0.635
3D body: height 7.3, standoff -2.5, extent -0.835,-0.2 -0.435,0.2
3D body: height 2.8, standoff 0, extent -2.54,-0.635 -1.27,0.635
3D body: height 7.3, standoff -2.5, extent -2.105,-0.2 -1.705,0.2
3D body: height 2.8, standoff 0, extent -3.81,-0.635 -2.54,0.635
3D body: height 7.3, standoff -2.5, extent -3.375,-0.2 -2.975,0.2
3D body: height 2.8, standoff 0, extent -5.08,-0.635 -3.81,0.635
3D body: height 7.3, standoff -2.5, extent -4.645,-0.2 -4.245,0.2
3D body: height 2.8, standoff 0, extent -6.35,-0.635 -5.08,0.635
3D body: height 7.3, standoff -2.5, extent -5.915,-0.2 -5.515,0.2
3D body: height 2.8, standoff 0, extent -7.62,-0.635 -6.35,0.635
3D body: height 7.3, standoff -2.5, extent -7.185,-0.2 -6.785,0.2
3D body: height 2.8, standoff 0, extent 3.81,-0.635 5.08,0.635
3D body: height 7.3, standoff -2.5, extent 4.245,-0.2 4.645,0.2
3D body: height 2.8, standoff 0, extent 6.35,-0.635 7.62,0.635
3D body: height 7.3, standoff -2.5, extent 6.785,-0.2 7.185,0.2
3D body: height 2.8, standoff 0, extent 5.08,-0.635 6.35,0.635
3D body: height 7.3, standoff -2.5, extent 5.515,-0.2 5.915,0.2

## HDRMINI_M_1X13 [mm] "mini header (50mil pitch)"
pads (13):
  round 1 / inner round 1 / far side oval 1x1.4 hole 0.7 mask+0.05: 1(-7.62,0) 2(-6.35,0) 3(-5.08,0) 4(-3.81,0) 5(-2.54,0) 6(-1.27,0) 7(0,0) 8(1.27,0) 9(2.54,0) 10(3.81,0) 11(5.08,0) 12(6.35,0) 13(7.62,0)
Top Overlay:
  circle w0.2: c-8.763,0 r0.2
  lines w0.2: -8.255,-0.635 -8.255,0.635 -8.156,0.8 -7.084,0.8 -6.985,0.635 -6.886,0.8 -5.814,0.8 -5.715,0.635 -5.616,0.8 -4.544,0.8 -4.445,0.635 -4.346,0.8 -3.274,0.8 -3.175,0.635 -3.076,0.8 -2.004,0.8 -1.905,0.635 -1.806,0.8 -0.734,0.8 -0.635,0.635 -0.536,0.8 0.536,0.8 0.635,0.635 0.734,0.8 1.806,0.8 1.905,0.635 2.004,0.8 3.076,0.8 3.175,0.635 3.274,0.8 4.346,0.8 4.445,0.635 4.544,0.8 5.616,0.8 5.715,0.635 5.815,0.8 6.887,0.8 6.986,0.635 7.085,0.8 8.157,0.8 8.256,0.635 8.256,-0.635 8.157,-0.8 7.085,-0.8 6.986,-0.635 6.887,-0.8 5.815,-0.8 5.716,-0.635 5.616,-0.8 4.544,-0.8 4.445,-0.635 4.346,-0.8 3.274,-0.8 3.175,-0.635 3.076,-0.8 2.004,-0.8 1.905,-0.635 1.806,-0.8 0.734,-0.8 0.635,-0.635 0.536,-0.8 -0.536,-0.8 -0.635,-0.635 -0.734,-0.8 -1.806,-0.8 -1.905,-0.635 -2.004,-0.8 -3.076,-0.8 -3.175,-0.635 -3.274,-0.8 -4.346,-0.8 -4.445,-0.635 -4.544,-0.8 -5.616,-0.8 -5.715,-0.635 -5.814,-0.8 -6.886,-0.8 -6.985,-0.635 -7.084,-0.8 -8.156,-0.8 -8.255,-0.635
3D body: height 2.8, standoff 0, extent 1.905,-0.635 3.175,0.635
3D body: height 7.3, standoff -2.5, extent 2.34,-0.2 2.74,0.2
3D body: height 2.8, standoff 0, extent 0.635,-0.635 1.905,0.635
3D body: height 7.3, standoff -2.5, extent 1.07,-0.2 1.47,0.2
3D body: height 2.8, standoff 0, extent -0.635,-0.635 0.635,0.635
3D body: height 7.3, standoff -2.5, extent -0.2,-0.2 0.2,0.2
3D body: height 2.8, standoff 0, extent -1.905,-0.635 -0.635,0.635
3D body: height 7.3, standoff -2.5, extent -1.47,-0.2 -1.07,0.2
3D body: height 2.8, standoff 0, extent -3.175,-0.635 -1.905,0.635
3D body: height 7.3, standoff -2.5, extent -2.74,-0.2 -2.34,0.2
3D body: height 2.8, standoff 0, extent -4.445,-0.635 -3.175,0.635
3D body: height 7.3, standoff -2.5, extent -4.01,-0.2 -3.61,0.2
3D body: height 2.8, standoff 0, extent -5.715,-0.635 -4.445,0.635
3D body: height 7.3, standoff -2.5, extent -5.28,-0.2 -4.88,0.2
3D body: height 2.8, standoff 0, extent -6.985,-0.635 -5.715,0.635
3D body: height 7.3, standoff -2.5, extent -6.55,-0.2 -6.15,0.2
3D body: height 2.8, standoff 0, extent -8.255,-0.635 -6.985,0.635
3D body: height 7.3, standoff -2.5, extent -7.82,-0.2 -7.42,0.2
3D body: height 2.8, standoff 0, extent 3.175,-0.635 4.445,0.635
3D body: height 7.3, standoff -2.5, extent 3.61,-0.2 4.01,0.2
3D body: height 2.8, standoff 0, extent 6.985,-0.635 8.255,0.635
3D body: height 7.3, standoff -2.5, extent 7.42,-0.2 7.82,0.2
3D body: height 2.8, standoff 0, extent 5.715,-0.635 6.985,0.635
3D body: height 7.3, standoff -2.5, extent 6.15,-0.2 6.55,0.2
3D body: height 2.8, standoff 0, extent 4.445,-0.635 5.715,0.635
3D body: height 7.3, standoff -2.5, extent 4.88,-0.2 5.28,0.2

## HDRMINI_M_1X14 [mm] "mini header (50mil pitch)"
pads (14):
  round 1 / inner round 1 / far side oval 1x1.4 hole 0.7 mask+0.05: 1(-8.255,0) 2(-6.985,0) 3(-5.715,0) 4(-4.445,0) 5(-3.175,0) 6(-1.905,0) 7(-0.635,0) 8(0.635,0) 9(1.905,0) 10(3.175,0) 11(4.445,0) 12(5.715,0) 13(6.985,0) 14(8.255,0)
Top Overlay:
  circle w0.2: c-9.398,0 r0.2
  lines w0.2: -8.89,-0.635 -8.89,0.635 -8.791,0.8 -7.719,0.8 -7.62,0.635 -7.521,0.8 -6.449,0.8 -6.35,0.635 -6.251,0.8 -5.179,0.8 -5.08,0.635 -4.981,0.8 -3.909,0.8 -3.81,0.635 -3.711,0.8 -2.639,0.8 -2.54,0.635 -2.441,0.8 -1.369,0.8 -1.27,0.635 -1.171,0.8 -0.099,0.8 0,0.635 0.099,0.8 1.171,0.8 1.27,0.635 1.369,0.8 2.441,0.8 2.54,0.635 2.639,0.8 3.711,0.8 3.81,0.635 3.909,0.8 4.981,0.8 5.08,0.635 5.18,0.8 6.252,0.8 6.351,0.635 6.45,0.8 7.522,0.8 7.621,0.635 7.72,0.8 8.792,0.8 8.891,0.635 8.891,-0.635 8.792,-0.8 7.72,-0.8 7.621,-0.635 7.522,-0.8 6.45,-0.8 6.351,-0.635 6.252,-0.8 5.18,-0.8 5.081,-0.635 4.981,-0.8 3.909,-0.8 3.81,-0.635 3.711,-0.8 2.639,-0.8 2.54,-0.635 2.441,-0.8 1.369,-0.8 1.27,-0.635 1.171,-0.8 0.099,-0.8 0,-0.635 -0.099,-0.8 -1.171,-0.8 -1.27,-0.635 -1.369,-0.8 -2.441,-0.8 -2.54,-0.635 -2.639,-0.8 -3.711,-0.8 -3.81,-0.635 -3.909,-0.8 -4.981,-0.8 -5.08,-0.635 -5.179,-0.8 -6.251,-0.8 -6.35,-0.635 -6.449,-0.8 -7.521,-0.8 -7.62,-0.635 -7.719,-0.8 -8.791,-0.8 -8.89,-0.635
3D body: height 7.3, standoff -2.5, extent 4.245,-0.2 4.645,0.2
3D body: height 2.8, standoff 0, extent 3.81,-0.635 5.08,0.635
3D body: height 7.3, standoff -2.5, extent 5.515,-0.2 5.915,0.2
3D body: height 2.8, standoff 0, extent 5.08,-0.635 6.35,0.635
3D body: height 7.3, standoff -2.5, extent 6.785,-0.2 7.185,0.2
3D body: height 2.8, standoff 0, extent 6.35,-0.635 7.62,0.635
3D body: height 7.3, standoff -2.5, extent 8.055,-0.2 8.455,0.2
3D body: height 2.8, standoff 0, extent 7.62,-0.635 8.89,0.635
3D body: height 7.3, standoff -2.5, extent 2.975,-0.2 3.375,0.2
3D body: height 2.8, standoff 0, extent 2.54,-0.635 3.81,0.635
3D body: height 7.3, standoff -2.5, extent -8.455,-0.2 -8.055,0.2
3D body: height 2.8, standoff 0, extent -8.89,-0.635 -7.62,0.635
3D body: height 7.3, standoff -2.5, extent -7.185,-0.2 -6.785,0.2
3D body: height 2.8, standoff 0, extent -7.62,-0.635 -6.35,0.635
3D body: height 7.3, standoff -2.5, extent -5.915,-0.2 -5.515,0.2
3D body: height 2.8, standoff 0, extent -6.35,-0.635 -5.08,0.635
3D body: height 7.3, standoff -2.5, extent -4.645,-0.2 -4.245,0.2
3D body: height 2.8, standoff 0, extent -5.08,-0.635 -3.81,0.635
3D body: height 7.3, standoff -2.5, extent -3.375,-0.2 -2.975,0.2
3D body: height 2.8, standoff 0, extent -3.81,-0.635 -2.54,0.635
3D body: height 7.3, standoff -2.5, extent -2.105,-0.2 -1.705,0.2
3D body: height 2.8, standoff 0, extent -2.54,-0.635 -1.27,0.635
3D body: height 7.3, standoff -2.5, extent -0.835,-0.2 -0.435,0.2
3D body: height 2.8, standoff 0, extent -1.27,-0.635 0,0.635
3D body: height 7.3, standoff -2.5, extent 0.435,-0.2 0.835,0.2
3D body: height 2.8, standoff 0, extent 0,-0.635 1.27,0.635
3D body: height 7.3, standoff -2.5, extent 1.705,-0.2 2.105,0.2
3D body: height 2.8, standoff 0, extent 1.27,-0.635 2.54,0.635

## HDRMINI_M_1X15 [mm] "mini header (50mil pitch)"
pads (15):
  round 1 / inner round 1 / far side oval 1x1.4 hole 0.7 mask+0.05: 1(-8.89,0) 2(-7.62,0) 3(-6.35,0) 4(-5.08,0) 5(-3.81,0) 6(-2.54,0) 7(-1.27,0) 8(0,0) 9(1.27,0) 10(2.54,0) 11(3.81,0) 12(5.08,0) 13(6.35,0) 14(7.62,0) 15(8.89,0)
Top Overlay:
  circle w0.2: c-10.033,0 r0.2
  lines w0.2: -9.525,-0.635 -9.525,0.635 -9.426,0.8 -8.354,0.8 -8.255,0.635 -8.156,0.8 -7.084,0.8 -6.985,0.635 -6.886,0.8 -5.814,0.8 -5.715,0.635 -5.616,0.8 -4.544,0.8 -4.445,0.635 -4.346,0.8 -3.274,0.8 -3.175,0.635 -3.076,0.8 -2.004,0.8 -1.905,0.635 -1.806,0.8 -0.734,0.8 -0.635,0.635 -0.536,0.8 0.536,0.8 0.635,0.635 0.734,0.8 1.806,0.8 1.905,0.635 2.004,0.8 3.076,0.8 3.175,0.635 3.274,0.8 4.346,0.8 4.445,0.635 4.545,0.8 5.617,0.8 5.716,0.635 5.815,0.8 6.887,0.8 6.986,0.635 7.085,0.8 8.157,0.8 8.256,0.635 8.355,0.8 9.427,0.8 9.526,0.635 9.526,-0.635 9.427,-0.8 8.355,-0.8 8.256,-0.635 8.157,-0.8 7.085,-0.8 6.986,-0.635 6.887,-0.8 5.815,-0.8 5.716,-0.635 5.617,-0.8 4.545,-0.8 4.446,-0.635 4.346,-0.8 3.274,-0.8 3.175,-0.635 3.076,-0.8 2.004,-0.8 1.905,-0.635 1.806,-0.8 0.734,-0.8 0.635,-0.635 0.536,-0.8 -0.536,-0.8 -0.635,-0.635 -0.734,-0.8 -1.806,-0.8 -1.905,-0.635 -2.004,-0.8 -3.076,-0.8 -3.175,-0.635 -3.274,-0.8 -4.346,-0.8 -4.445,-0.635 -4.544,-0.8 -5.616,-0.8 -5.715,-0.635 -5.814,-0.8 -6.886,-0.8 -6.985,-0.635 -7.084,-0.8 -8.156,-0.8 -8.255,-0.635 -8.354,-0.8 -9.426,-0.8 -9.525,-0.635
3D body: height 2.8, standoff 0, extent 0.635,-0.635 1.905,0.635
3D body: height 7.3, standoff -2.5, extent 1.07,-0.2 1.47,0.2
3D body: height 2.8, standoff 0, extent -0.635,-0.635 0.635,0.635
3D body: height 7.3, standoff -2.5, extent -0.2,-0.2 0.2,0.2
3D body: height 2.8, standoff 0, extent -1.905,-0.635 -0.635,0.635
3D body: height 7.3, standoff -2.5, extent -1.47,-0.2 -1.07,0.2
3D body: height 2.8, standoff 0, extent -3.175,-0.635 -1.905,0.635
3D body: height 7.3, standoff -2.5, extent -2.74,-0.2 -2.34,0.2
3D body: height 2.8, standoff 0, extent -4.445,-0.635 -3.175,0.635
3D body: height 7.3, standoff -2.5, extent -4.01,-0.2 -3.61,0.2
3D body: height 2.8, standoff 0, extent -5.715,-0.635 -4.445,0.635
3D body: height 7.3, standoff -2.5, extent -5.28,-0.2 -4.88,0.2
3D body: height 2.8, standoff 0, extent -6.985,-0.635 -5.715,0.635
3D body: height 7.3, standoff -2.5, extent -6.55,-0.2 -6.15,0.2
3D body: height 2.8, standoff 0, extent -8.255,-0.635 -6.985,0.635
3D body: height 7.3, standoff -2.5, extent -7.82,-0.2 -7.42,0.2
3D body: height 2.8, standoff 0, extent -9.525,-0.635 -8.255,0.635
3D body: height 7.3, standoff -2.5, extent -9.09,-0.2 -8.69,0.2
3D body: height 2.8, standoff 0, extent 1.905,-0.635 3.175,0.635
3D body: height 7.3, standoff -2.5, extent 2.34,-0.2 2.74,0.2
3D body: height 2.8, standoff 0, extent 8.255,-0.635 9.525,0.635
3D body: height 7.3, standoff -2.5, extent 8.69,-0.2 9.09,0.2
3D body: height 2.8, standoff 0, extent 6.985,-0.635 8.255,0.635
3D body: height 7.3, standoff -2.5, extent 7.42,-0.2 7.82,0.2
3D body: height 2.8, standoff 0, extent 5.715,-0.635 6.985,0.635
3D body: height 7.3, standoff -2.5, extent 6.15,-0.2 6.55,0.2
3D body: height 2.8, standoff 0, extent 4.445,-0.635 5.715,0.635
3D body: height 7.3, standoff -2.5, extent 4.88,-0.2 5.28,0.2
3D body: height 2.8, standoff 0, extent 3.175,-0.635 4.445,0.635
3D body: height 7.3, standoff -2.5, extent 3.61,-0.2 4.01,0.2